# Altium footprint library Connectors Pad Lib.PcbLib: 70 footprints (part 2 of 5)
Each footprint in its own frame and in the unit in brackets; x right, y up, seen from the top. Pads: shape width x height; smd on the part's side, far side on the other; paste and mask are expansions set on the pad; w line width, h text height; cw(c..) or ccw(c..) is an arc to the next point about the centre after c.
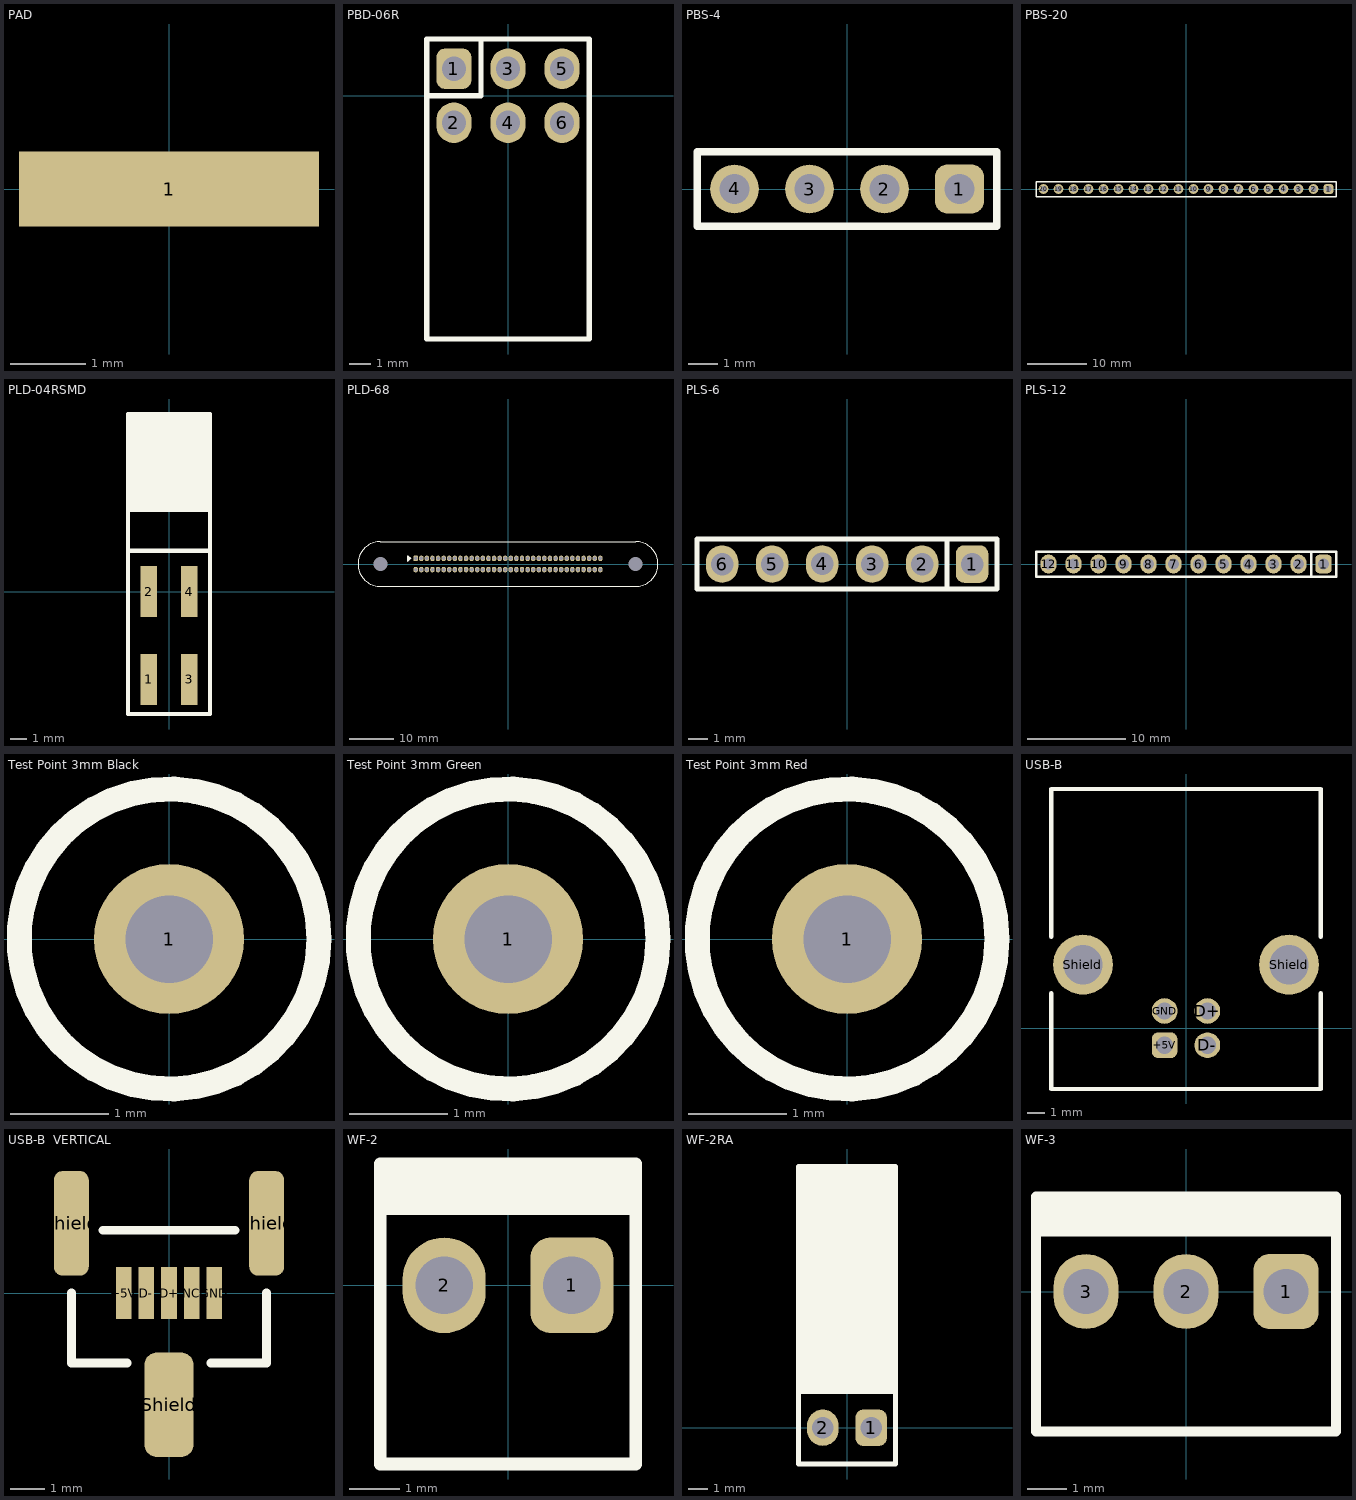
[diagram p1: the footprints below, top view; thin cyan lines are the x and y axes]

## PAD [mm]
pads (1):
  rect 4x1 smd: 1(0,0)

## PBD-06R [mil] "PCB Rigth Angle Connector 2x3-Pin"
pads (6):
  rrect50% 65x75 hole 45: 1(-100,50)
  oval 65x75 hole 45: 2(-100,-50) 3(0,50) 4(0,-50) 5(100,50) 6(100,-50)
Top Overlay:
  lines w10: -150,0 -50,0 -50,105 ; -150,-450 150,-450 150,105 -150,105 -150,-450
3D body "DS1024-2x3R(PBD-06R CONNFLY).STEP": height 197.85, standoff -117.11, extent -150,-450.9 150,60.91

## PBS-4 [mil] "PCB Vertical Connector 4-Pin"
pads (4):
  rrect50% 65x65 hole 39.37: 1(150,0)
  round 65 hole 39.37: 2(50,0) 3(-50,0) 4(-150,0)
Top Overlay:
  lines w10: -200,-50 200,-50 200,50 -200,50 -200,-50
3D body "DS1023-1X4(PBS-4 CONNFLY).STEP": height 330.71, standoff -125.98, extent -200,-50 200,50

## PBS-20 [mil] "PCB Vertical Connector 20-Pin"
pads (20):
  rrect50% 65x65 hole 39.37: 1(950,0)
  round 65 hole 39.37: 2(850,0) 3(750,0) 4(650,0) 5(550,0) 6(450,0) 7(350,0) 8(250,0) 9(150,0) 10(50,0) 11(-50,0) 12(-150,0) 13(-250,0) 14(-350,0) 15(-450,0) 16(-550,0) 17(-650,0) 18(-750,0) 19(-850,0) 20(-950,0)
Top Overlay:
  lines w10: -1000,-50 1000,-50 1000,50 -1000,50 -1000,-50
3D body "DS1023-1X20(PBS-20 CONNFLY).STEP": height 331.71, standoff -124.98, extent -1000,-50 1000,50

## PLD-04RSMD [mil] "Right Angled Dual Row Connector SMD PLD-04RSMD 3A 250V"
pads (4):
  rect 40x125 smd: 1(-50,-215) 2(-50,0) 3(50,-215) 4(50,0)
Top Overlay:
  rectangle: -100,200 100,435
  lines w10: -100,100 100,100 ; -100,200 100,200 ; -100,-300 -100,435 100,435 100,-300 -100,-300
3D body "1225-122.STEP": height 197.85, standoff 1, extent -100,-234.65 100,434.65

## PLD-68 [mil] "PCB Vertical Connector 2x68"
pads (70):
  rrect50% 40x50 hole 30: 1(-825,50)
  oval 40x50 hole 30: 2(-775,50) 3(-725,50) 4(-675,50) 5(-625,50) 6(-575,50) 7(-525,50) 8(-475,50) 9(-425,50) 10(-375,50) 11(-325,50) 12(-275,50) 13(-225,50) 14(-175,50) 15(-125,50) 16(-75,50) 17(-25,50) 18(25,50) 19(75,50) 20(125,50) 21(175,50) 22(225,50) 23(275,50) 24(325,50) 25(375,50) 26(425,50) 27(475,50) 28(525,50) 29(575,50) 30(625,50) 31(675,50) 32(725,50) 33(775,50) 34(825,50) 35(-825,-50) 36(-775,-50) 37(-725,-50) 38(-675,-50) 39(-625,-50) 40(-575,-50) 41(-525,-50) 42(-475,-50) 43(-425,-50) 44(-375,-50) 45(-325,-50) 46(-275,-50) 47(-225,-50) 48(-175,-50) 49(-125,-50) 50(-75,-50) 51(-25,-50) 52(25,-50) 53(75,-50) 54(125,-50) 55(175,-50) 56(225,-50) 57(275,-50) 58(325,-50) 59(375,-50) 60(425,-50) 61(475,-50) 62(525,-50) 63(575,-50) 64(625,-50) 65(675,-50) 66(725,-50) 67(775,-50) 68(825,-50)
  round 0 hole 125.98 unplated: ""(-1140,0) ""(1140,0)
Top Overlay:
  region: -870,50 -895,75 -895,25
  lines w10: -1140,-200.56 cw(c-1140,0) -1140,200.56 ; -1140,-200 1140,-200 ; -1140,200 1140,200 ; 1140,-200.25 ccw(c1140,0) 1140,200.25 ; -895,25 -870,50 -895,75 -895,25
3D body "PLD-68-1.27.STEP": height 210.24, standoff -102.36, extent -850,-98.42 850,98.43

## PLS-6 [mil] "PCB Vertical Connector 6-Pin"
pads (6):
  rrect50% 65x75 hole 45: 1(250,0)
  oval 65x75 hole 45: 2(150,0) 3(50,0) 4(-50,0) 5(-150,0) 6(-250,0)
Top Overlay:
  lines w10: 200,-50 200,50 ; -300,-50 300,-50 300,50 -300,50 -300,-50
3D body "DS1021-1X6SF1(PLS-6 Connfly).step": height 337.22, standoff -117.11, extent -300,-50 300,50

## PLS-12 [mil] "PCB Vertical Connector 6-Pin"
pads (12):
  rrect50% 65x75 hole 45: 1(550,0)
  oval 65x75 hole 45: 2(450,0) 3(350,0) 4(250,0) 5(150,0) 6(50,0) 7(-50,0) 8(-150,0) 9(-250,0) 10(-350,0) 11(-450,0) 12(-550,0)
Top Overlay:
  lines w10: 500,-50 500,50 ; -600,-50 600,-50 600,50 -600,50 -600,-50
3D body "DS1021-1X12SF1(PLS-12 Connfly).step": height 338.22, standoff -116.11, extent -600,-50 600,50

## Test Point 3mm Black [mil] "Test Point 3mm Connector, Black Color"
pads (1):
  round 60 hole 35: 1(0,0)
Top Overlay:
  circle w10: c0,0 r60
3D body "Test Point Black.STEP": height 171.73, standoff -101.23, extent -49.99,-51.76 50.01,51.88

## Test Point 3mm Green [mil] "Test Point 3mm Connector, Green Color"
pads (1):
  round 60 hole 35: 1(0,0)
Top Overlay:
  circle w10: c0,0 r60
3D body "Test Point Green.STEP": height 171.73, standoff -101.23, extent -49.99,-51.76 50.01,51.88

## Test Point 3mm Red [mil] "Test Point 3mm Connector, Red Color"
pads (1):
  round 60 hole 35: 1(0,0)
Top Overlay:
  circle w10: c0,0 r60
3D body "Test Point Red.STEP": height 171.73, standoff -101.23, extent -49.99,-51.76 50.01,51.88

## USB-B [mm] "USB-B (DS1099-W)"
pads (6):
  rrect50% 1.5x1.5 hole 1: +5V(-1.25,-1)
  round 1.5 hole 1: D+(1.25,1) D-(1.25,-1) GND(-1.25,1)
  round 3.5 hole 2.3: Shield(-6.02,3.71) Shield(6.02,3.71)
Top Overlay:
  lines w0.254: -7.874,2.032 -7.874,-3.556 7.874,-3.556 7.874,2.032 ; -7.874,5.334 -7.874,13.97 7.874,13.97 7.874,5.334
3D body "DS1099-W(USB-B CONNFLY).STEP": height 11, standoff -4.42, extent -7.444,-3 7.441,14

## USB-B  VERTICAL [mm] "USB, MICRO-B  VERTICAL TYPE"
pads (8):
  rect 0.45x1.5 smd: +5V(-1.3,0) D+(0,0) D-(-0.65,0) GND(1.3,0) NC(0.65,0)
  rrect50% 1x3 smd: Shield(-2.8,2) Shield(2.8,2)
  rrect50% 1.4x3 smd: Shield(0,-3.2)
Top Overlay:
  lines w0.254: -2.8,0 -2.8,-2 -1.2,-2 ; -1.9,1.8 1.9,1.8 ; 1.2,-2 2.8,-2 2.8,0

## WF-2 [mil] "PCB Vertical Connector 2-Pin"
pads (2):
  rrect50% 65x75 hole 45: 1(50,0)
  oval 65x75 hole 45: 2(-50,0)
Top Overlay:
  rectangle: -100,60 100,95
  lines w10: -100,60 100,60 ; -100,-140 -100,95 100,95 100,-140 -100,-140
3D body "DS1070-2 (WF-2 CONNFLY).step": height 449.82, standoff -128.92, extent -99.99,-137.79 100.01,94.49

## WF-2RA [mil] "PCB Rigth Angle Connector 2-Pin"
pads (2):
  rrect50% 65x75 hole 45: 1(50,0)
  oval 65x75 hole 45: 2(-50,0)
Top Overlay:
  rectangle: -100,75 100,545
  lines w10: -100,75 100,75 ; -100,-75 100,-75 100,540 -100,540 -100,-75
3D body "DS1070-2MR (WF-2RA CONNFLY).step": height 233.28, standoff -132.86, extent -99.99,-12.6 100.01,542.52

## WF-3 [mil] "PCB Vertical Connector 3-Pin"
pads (3):
  rrect50% 65x75 hole 45: 1(100,0)
  oval 65x75 hole 45: 2(0,0) 3(-100,0)
Top Overlay:
  rectangle: -150,60 150,95
  lines w10: -150,60 150,60 ; -150,-140 150,-140 150,95 -150,95 -150,-140
3D body "DS1070-3 (WF-3 CONNFLY).step": height 449.82, standoff -128.92, extent -149.99,-137.79 150.01,94.5